# Altium footprint library Connectors.PcbLib: 56 footprints (part 3 of 4)
Each footprint in its own frame and in the unit in brackets; x right, y up, seen from the top. Pads: shape width x height; smd on the part's side, far side on the other; paste and mask are expansions set on the pad; w line width, h text height; cw(c..) or ccw(c..) is an arc to the next point about the centre after c.
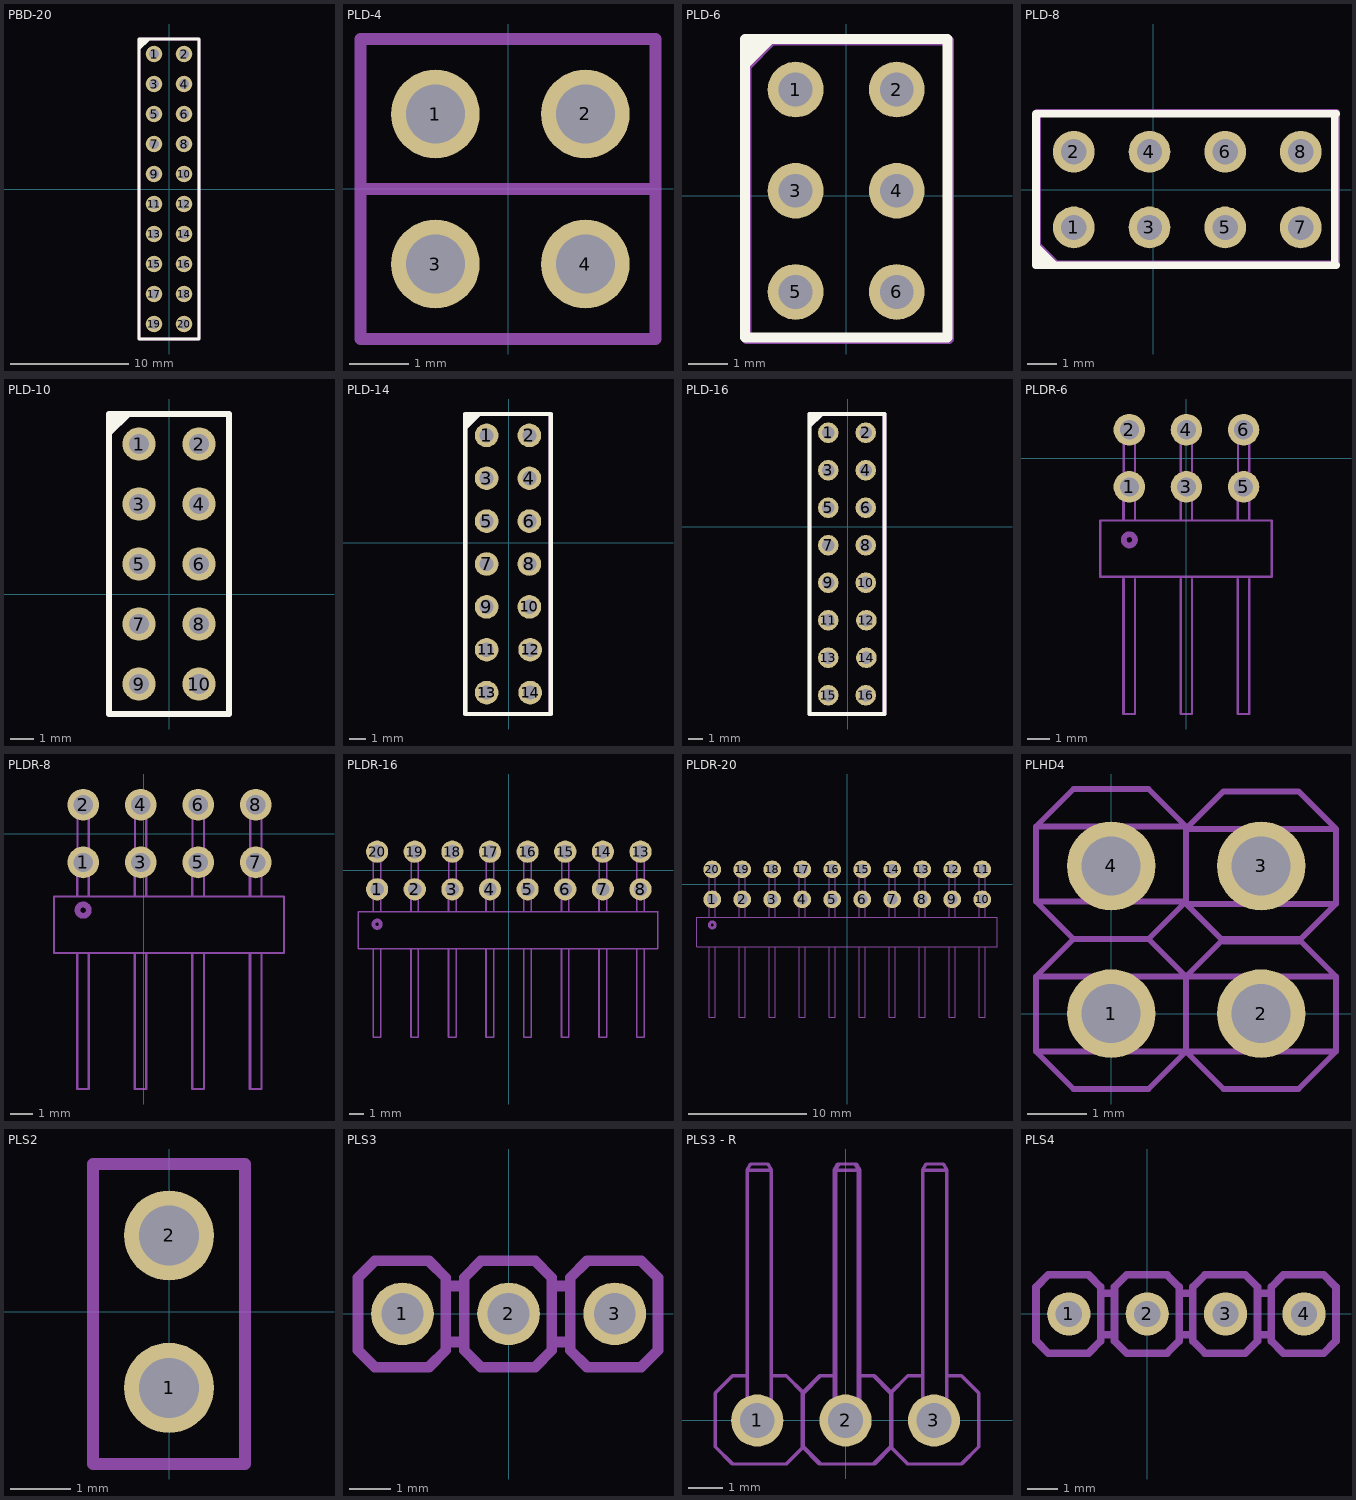
[diagram p2: the footprints below, top view; thin cyan lines are the x and y axes]

## PBD-20 [mm]
pads (20):
  round 1.4 hole 0.85: 1(-1.27,11.43) 2(1.27,11.43) 3(-1.27,8.89) 4(1.27,8.89) 5(-1.27,6.35) 6(1.27,6.35) 7(-1.27,3.81) 8(1.27,3.81) 9(-1.27,1.27) 10(1.27,1.27) 11(-1.27,-1.27) 12(1.27,-1.27) 13(-1.27,-3.81) 14(1.27,-3.81) 15(-1.27,-6.35) 16(1.27,-6.35) 17(-1.27,-8.89) 18(1.27,-8.89) 19(-1.27,-11.43) 20(1.27,-11.43)
Top Overlay:
  region: -1.55,12.7 -2.54,11.71 -2.54,12.7
  region: -2,12.7
  lines w0.254: -2.54,-12.7 -2.54,12.7 2.54,12.7 2.54,-12.7 -2.54,-12.7
Mechanical 13:
  lines w0.254: -2.54,-12.7 2.54,-12.7 2.54,12.7 -2.54,12.7 -2.54,-12.7
3D body "User Library-PBD2_54-20.step": height 8.4, standoff -2.7, extent -2.54,-12.7 2.54,12.7

## PLD-4 [mm]
pads (4):
  round 1.5 hole 1: 1(-1.23,1.27) 2(1.31,1.27) 3(-1.23,-1.27) 4(1.31,-1.27)
Mechanical 13:
  lines w0.2: -2.5,0 2.5,0 ; -2.5,0 -2.5,2.54 2.5,2.54 2.5,0 ; -2.5,0 -2.5,-2.54 2.5,-2.54 2.5,0 ; -2.5,0 2.5,0
3D body "User Library-PLD-2.step": height 8.5, standoff -3, extent -2.5,0 2.5,2.54
3D body "User Library-PLD-2.step": height 8.5, standoff -3, extent -2.5,-2.54 2.5,0

## PLD-6 [mm]
pads (6):
  round 1.4 hole 0.85: 1(-1.27,2.667) 2(1.27,2.667) 3(-1.27,0.127) 4(1.27,0.127) 5(-1.27,-2.413) 6(1.27,-2.413)
Top Overlay:
  lines w0.254: -2.54,3.302 -1.905,3.937 ; -2.54,3.556 -2.159,3.937 ; -2.54,-3.556 2.54,-3.556 2.54,3.937 -2.54,3.937 -2.54,-3.556
Mechanical 13:
  lines w0.254: -2.5,3.262 -1.865,3.897 ; -2.5,3.516 -2.119,3.897 ; -2.5,-3.596 -2.5,3.897 2.58,3.897 2.58,-3.596 -2.5,-3.596
3D body "User Library-PLD-2.step": height 8.5, standoff -3, extent -2.5,-3.683 2.5,-1.143
3D body "User Library-PLD-2.step": height 8.5, standoff -3, extent -2.5,-1.143 2.5,1.397
3D body "User Library-PLD-2.step": height 8.5, standoff -3, extent -2.5,1.397 2.5,3.937

## PLD-8 [mm]
pads (8):
  round 1.4 hole 0.85: 1(-2.667,-1.27) 2(-2.667,1.27) 3(-0.127,-1.27) 4(-0.127,1.27) 5(2.413,-1.27) 6(2.413,1.27) 7(4.953,-1.27) 8(4.953,1.27)
Top Overlay:
  lines w0.254: -3.937,-2.159 -3.556,-2.54 ; -3.937,-1.905 -3.302,-2.54 ; 6.096,-2.54 6.096,2.54 ; 6.136,-2.54 -3.937,-2.54 -3.937,2.54 6.136,2.54
Mechanical 13:
  lines w0.254: -3.897,-2.119 -3.516,-2.5 ; -3.897,-1.865 -3.262,-2.5 ; -3.897,-2.5 6.136,-2.5 6.136,2.58 -3.897,2.58 -3.897,-2.5
3D body "User Library-PLD-2.step": height 8.5, standoff -3, extent -3.937,-2.5 -1.397,2.5
3D body "User Library-PLD-2.step": height 8.5, standoff -3, extent -1.397,-2.5 1.143,2.5
3D body "User Library-PLD-2.step": height 8.5, standoff -3, extent 1.143,-2.5 3.683,2.5
3D body "User Library-PLD-2.step": height 8.5, standoff -3, extent 3.683,-2.5 6.223,2.5

## PLD-10 [mm]
pads (10):
  round 1.4 hole 0.85: 1(-1.27,6.35) 2(1.27,6.35) 3(-1.27,3.81) 4(1.27,3.81) 5(-1.27,1.27) 6(1.27,1.27) 7(-1.27,-1.27) 8(1.27,-1.27) 9(-1.27,-3.81) 10(1.27,-3.81)
Top Overlay:
  region: -1.55,7.62 -2.54,6.63 -2.54,7.62
  region: -2,7.62
  lines w0.254: -2.54,-5.08 2.54,-5.08 2.54,7.62 -2.54,7.62 -2.54,-5.08
Mechanical 13:
  lines w0.254: -2.54,-5.08 2.54,-5.08 2.54,7.62 -2.54,7.62 -2.54,-5.08
3D body "User Library-PLD-2.step": height 8.5, standoff -3, extent -2.46,5.08 2.54,7.62
3D body "User Library-PLD-2.step": height 8.5, standoff -3, extent -2.46,0 2.54,2.54
3D body "User Library-PLD-2.step": height 8.5, standoff -3, extent -2.46,2.54 2.54,5.08
3D body "User Library-PLD-2.step": height 8.5, standoff -3, extent -2.46,-5.08 2.54,-2.54
3D body "User Library-PLD-2.step": height 8.5, standoff -3, extent -2.46,-2.54 2.54,0

## PLD-14 [mm]
pads (14):
  round 1.4 hole 0.85: 1(-1.31,6.35) 2(1.23,6.35) 3(-1.31,3.81) 4(1.23,3.81) 5(-1.31,1.27) 6(1.23,1.27) 7(-1.31,-1.27) 8(1.23,-1.27) 9(-1.31,-3.81) 10(1.23,-3.81) 11(-1.31,-6.35) 12(1.27,-6.35) 13(-1.31,-8.89) 14(1.27,-8.89)
Top Overlay:
  region: -1.59,7.62 -2.58,6.63 -2.58,7.62
  region: -2.04,7.62
  lines w0.254: -2.58,-10.16 2.5,-10.16 2.5,7.62 -2.58,7.62 -2.58,-10.16
Mechanical 13:
  lines w0.254: -2.58,-10.16 2.5,-10.16 2.5,7.62 -2.58,7.62 -2.58,-10.16
3D body "User Library-PLD-2.step": height 8.5, standoff -3, extent -2.5,5.08 2.5,7.62
3D body "User Library-PLD-2.step": height 8.5, standoff -3, extent -2.5,0 2.5,2.54
3D body "User Library-PLD-2.step": height 8.5, standoff -3, extent -2.5,2.54 2.5,5.08
3D body "User Library-PLD-2.step": height 8.5, standoff -3, extent -2.5,-5.08 2.5,-2.54
3D body "User Library-PLD-2.step": height 8.5, standoff -3, extent -2.5,-2.54 2.5,0
3D body "User Library-PLD-2.step": height 8.5, standoff -3, extent -2.5,-7.62 2.5,-5.08
3D body "User Library-PLD-2.step": height 8.5, standoff -3, extent -2.5,-10.16 2.5,-7.62

## PLD-16 [mm]
pads (16):
  round 1.4 hole 0.85: 1(-1.31,6.35) 2(1.23,6.35) 3(-1.31,3.81) 4(1.23,3.81) 5(-1.31,1.27) 6(1.23,1.27) 7(-1.31,-1.27) 8(1.23,-1.27) 9(-1.31,-3.81) 10(1.23,-3.81) 11(-1.31,-6.35) 12(1.27,-6.35) 13(-1.31,-8.89) 14(1.27,-8.89) 15(-1.31,-11.43) 16(1.23,-11.43)
Top Overlay:
  region: -2.04,7.62
  region: -1.59,7.62 -2.58,6.63 -2.58,7.62
  lines w0.254: -2.58,-12.7 -2.58,7.62 2.5,7.62 2.5,-12.7 -2.58,-12.7
Mechanical 13:
  lines w0.254: -2.58,-12.7 -2.58,7.62 2.5,7.62 2.5,-12.7 -2.58,-12.7
3D body "User Library-PLD-2.step": height 8.5, standoff -3, extent -2.5,-10.16 2.5,-7.62
3D body "User Library-PLD-2.step": height 8.5, standoff -3, extent -2.5,-7.62 2.5,-5.08
3D body "User Library-PLD-2.step": height 8.5, standoff -3, extent -2.5,-2.54 2.5,0
3D body "User Library-PLD-2.step": height 8.5, standoff -3, extent -2.5,-5.08 2.5,-2.54
3D body "User Library-PLD-2.step": height 8.5, standoff -3, extent -2.5,2.54 2.5,5.08
3D body "User Library-PLD-2.step": height 8.5, standoff -3, extent -2.5,0 2.5,2.54
3D body "User Library-PLD-2.step": height 8.5, standoff -3, extent -2.5,5.08 2.5,7.62
3D body "User Library-PLD-2.step": height 8.5, standoff -3, extent -2.5,-12.7 2.5,-10.16

## PLDR-6 [mm]
pads (6):
  round 1.4 hole 0.85: 1(-2.54,-1.27) 2(-2.54,1.27) 3(0,-1.27) 4(0,1.27) 5(2.54,-1.27) 6(2.54,1.27)
Mechanical 13:
  circle w0.254: c-2.54,-3.627 r0.25
  circle w0.1: c-2.54,-1.397 r0.25
  circle w0.1: c0,-1.397 r0.25
  circle w0.1: c2.54,-1.397 r0.25
  circle w0.1: c-2.54,1.016 r0.25
  circle w0.1: c0,1.016 r0.25
  circle w0.1: c2.54,1.016 r0.25
  lines w0.1: -2.81,-5.373 -2.81,-11.373 -2.79,-11.373 ; -2.81,-2.77 -2.81,-0.73 -2.79,-0.73 ; -2.79,-5.373 -2.79,-11.373 ; -2.79,-2.77 -2.79,1.27 -2.29,1.27 -2.29,-2.77 ; -2.29,-5.373 -2.29,-11.373 -2.79,-11.373 ; -0.27,-5.373 -0.27,-11.373 -0.25,-11.373 ; -0.27,-2.77 -0.27,-0.73 -0.25,-0.73 ; -0.25,-5.373 -0.25,-11.373 ; -0.25,-2.77 -0.25,1.27 0.25,1.27 0.25,-2.77 ; 0.25,-5.373 0.25,-11.373 -0.25,-11.373 ; 2.27,-5.373 2.27,-11.373 2.29,-11.373 ; 2.27,-2.77 2.27,-0.73 2.29,-0.73 ; 2.29,-5.373 2.29,-11.373 ; 2.29,-2.77 2.29,1.27 2.79,1.27 2.79,-2.77 ; 2.79,-5.373 2.79,-11.373 2.29,-11.373 ; -3.83,-5.27 -3.83,-2.77 3.79,-2.77 3.79,-5.27 -3.83,-5.27
3D body "User Library-PLDR-6.step": height 5.25, standoff -2.75, extent -3.81,-11.27 3.81,1.27

## PLDR-8 [mm]
pads (8):
  round 1.4 hole 0.85: 1(-2.667,-1.27) 2(-2.667,1.27) 3(-0.127,-1.27) 4(-0.127,1.27) 5(2.413,-1.27) 6(2.413,1.27) 7(4.953,-1.27) 8(4.953,1.27)
Mechanical 13:
  circle w0.254: c-2.667,-3.377 r0.25
  circle w0.1: c2.413,1.016 r0.25
  circle w0.1: c-0.127,1.016 r0.25
  circle w0.1: c-2.667,1.016 r0.25
  circle w0.1: c2.413,-1.397 r0.25
  circle w0.1: c-0.127,-1.397 r0.25
  circle w0.1: c-2.667,-1.397 r0.25
  circle w0.1: c4.953,1.016 r0.25
  circle w0.1: c2.413,1.016 r0.25
  circle w0.1: c-0.127,1.016 r0.25
  circle w0.1: c4.953,-1.397 r0.25
  circle w0.1: c2.413,-1.397 r0.25
  circle w0.1: c-0.127,-1.397 r0.25
  lines w0.1: -2.937,-5.27 -2.937,-11.27 -2.917,-11.27 ; -2.937,-2.77 -2.937,-0.73 -2.917,-0.73 ; -2.917,-5.27 -2.917,-11.27 ; -2.917,-2.77 -2.917,1.27 -2.417,1.27 -2.417,-2.77 ; -2.417,-5.27 -2.417,-11.27 -2.917,-11.27 ; -1.417,-5.27 6.203,-5.27 6.203,-2.77 -1.417,-2.77 ; 3.663,-5.27 -3.957,-5.27 -3.957,-2.77 3.663,-2.77 ; 4.683,-5.27 4.683,-11.27 4.703,-11.27 ; 4.683,-2.77 4.683,-0.73 4.703,-0.73 ; 4.703,-5.27 4.703,-11.27 ; 4.703,-2.77 4.703,1.27 5.203,1.27 5.203,-2.77 ; 5.203,-5.27 5.203,-11.27 4.703,-11.27 ; -0.397,-11.27 -0.397,-5.27 -0.397,-11.27 ; -0.397,-11.27 -0.377,-11.27 ; -0.397,-11.27 -0.377,-11.27 ; -0.397,-0.73 -0.397,-2.77 -0.397,-0.73 ; -0.397,-0.73 -0.377,-0.73 -0.397,-0.73 ; -0.377,-11.27 0.123,-11.27 ; -0.377,-11.27 -0.377,-5.27 -0.377,-11.27 ; -0.377,-11.27 0.123,-11.27 ; -0.377,1.27 0.123,1.27 ; -0.377,1.27 -0.377,-2.77 -0.377,1.27 ; -0.377,1.27 0.123,1.27 ; 0.123,-11.27 0.123,-5.27 0.123,-11.27 ; 0.123,1.27 0.123,-2.77 0.123,1.27 ; 2.143,-11.27 2.143,-5.27 2.143,-11.27 ; 2.143,-11.27 2.163,-11.27 ; 2.143,-11.27 2.163,-11.27 ; 2.143,-0.73 2.143,-2.77 2.143,-0.73 ; 2.143,-0.73 2.163,-0.73 2.143,-0.73 ; 2.163,-11.27 2.163,-5.27 2.163,-11.27 ; 2.163,-11.27 2.663,-11.27 ; 2.163,-11.27 2.663,-11.27 ; 2.163,1.27 2.163,-2.77 2.163,1.27 ; 2.163,1.27 2.663,1.27 ; 2.163,1.27 2.663,1.27 ; 2.663,-11.27 2.663,-5.27 2.663,-11.27 ; 2.663,1.27 2.663,-2.77 2.663,1.27
3D body "User Library-PLDR-6.step": height 5.75, standoff -2.25, extent -3.96,-11.207 3.66,1.333
3D body "User Library-PLDR-6.step": height 5.75, standoff -2.25, extent -1.42,-11.207 6.2,1.333

## PLDR-16 [mm]
pads (16):
  round 1.5 hole 0.9: 1(-8.89,-1.27) 2(-6.35,-1.27) 3(-3.81,-1.27) 4(-1.27,-1.27) 5(1.27,-1.27) 6(3.81,-1.27) 7(6.35,-1.27) 8(8.89,-1.27) 13(8.89,1.27) 14(6.35,1.27) 15(3.81,1.27) 16(1.27,1.27) 17(-1.27,1.27) 18(-3.81,1.27) 19(-6.35,1.27) 20(-8.89,1.27)
Mechanical 13:
  circle w0.254: c-8.89,-3.627 r0.25
  circle w0.1: c-8.89,-1.397 r0.25
  circle w0.1: c-6.35,-1.397 r0.25
  circle w0.1: c-3.81,-1.397 r0.25
  circle w0.1: c-1.27,-1.397 r0.25
  circle w0.1: c1.27,-1.397 r0.25
  circle w0.1: c3.81,-1.397 r0.25
  circle w0.1: c6.35,-1.397 r0.25
  circle w0.1: c8.89,-1.397 r0.25
  circle w0.1: c-8.89,1.016 r0.25
  circle w0.1: c-6.35,1.016 r0.25
  circle w0.1: c-3.81,1.016 r0.25
  circle w0.1: c-1.27,1.016 r0.25
  circle w0.1: c1.247,1.016 r0.25
  circle w0.1: c3.81,1.016 r0.25
  circle w0.1: c6.35,1.016 r0.25
  circle w0.1: c8.89,1.016 r0.25
  lines w0.1: -9.16,-5.27 -9.16,-11.27 -9.14,-11.27 ; -9.16,-2.77 -9.16,-0.73 -9.14,-0.73 ; -9.14,-5.27 -9.14,-11.27 ; -9.14,-2.77 -9.14,1.27 -8.64,1.27 -8.64,-2.77 ; -8.64,-5.27 -8.64,-11.27 -9.14,-11.27 ; -6.62,-5.27 -6.62,-11.27 -6.6,-11.27 ; -6.62,-2.77 -6.62,-0.73 -6.6,-0.73 ; -6.6,-5.27 -6.6,-11.27 ; -6.6,-2.77 -6.6,1.27 -6.1,1.27 -6.1,-2.77 ; -6.1,-5.27 -6.1,-11.27 -6.6,-11.27 ; -4.08,-5.27 -4.08,-11.27 -4.06,-11.27 ; -4.08,-2.77 -4.08,-0.73 -4.06,-0.73 ; -4.06,-5.27 -4.06,-11.27 ; -4.06,-2.77 -4.06,1.27 -3.56,1.27 -3.56,-2.77 ; -3.56,-5.27 -3.56,-11.27 -4.06,-11.27 ; -1.54,-5.27 -1.54,-11.27 -1.52,-11.27 ; -1.54,-2.77 -1.54,-0.73 -1.52,-0.73 ; -1.52,-5.27 -1.52,-11.27 ; -1.52,-2.77 -1.52,1.27 -1.02,1.27 -1.02,-2.77 ; -1.02,-5.27 -1.02,-11.27 -1.52,-11.27 ; 1,-5.27 1,-11.27 1.02,-11.27 ; 1,-2.77 1,-0.73 1.02,-0.73 ; 1.02,-5.27 1.02,-11.27 ; 1.02,-2.77 1.02,1.27 1.52,1.27 1.52,-2.77 ; 1.52,-5.27 1.52,-11.27 1.02,-11.27 ; 3.54,-5.27 3.54,-11.27 3.56,-11.27 ; 3.54,-2.77 3.54,-0.73 3.56,-0.73 ; 3.56,-5.27 3.56,-11.27 ; 3.56,-2.77 3.56,1.27 4.06,1.27 4.06,-2.77 ; 4.06,-5.27 4.06,-11.27 3.56,-11.27 ; 6.08,-5.27 6.08,-11.27 6.1,-11.27 ; 6.08,-2.77 6.08,-0.73 6.1,-0.73 ; 6.1,-5.27 6.1,-11.27 ; 6.1,-2.77 6.1,1.27 6.6,1.27 6.6,-2.77 ; 6.6,-5.27 6.6,-11.27 6.1,-11.27 ; 10.05,-2.77 10.05,-5.27 -2.56,-5.27 -10.18,-5.27 -10.18,-2.77 -2.56,-2.77 10.07,-2.77 ; 8.62,-11.27 8.64,-11.27 ; 8.62,-11.27 8.64,-11.27 ; 8.62,-11.27 8.62,-5.27 8.62,-11.27 ; 8.62,-0.73 8.64,-0.73 8.62,-0.73 ; 8.62,-0.73 8.62,-2.77 8.62,-0.73 ; 8.64,-11.27 9.14,-11.27 ; 8.64,-11.27 9.14,-11.27 ; 8.64,-11.27 8.64,-5.27 8.64,-11.27 ; 8.64,1.27 9.14,1.27 ; 8.64,1.27 9.14,1.27 ; 8.64,1.27 8.64,-2.77 8.64,1.27 ; 9.14,-11.27 9.14,-5.27 9.14,-11.27 ; 9.14,1.27 9.14,-2.77 9.14,1.27
3D body "User Library-PLDR-6.step": height 5.25, standoff -2.75, extent 2.517,-11.207 10.137,1.333
3D body "User Library-PLDR-6.step": height 5.25, standoff -2.75, extent -10.183,-11.207 -2.563,1.333
3D body "User Library-PLDR-6.step": height 5.25, standoff -2.75, extent -2.563,-11.207 5.057,1.333

## PLDR-20 [mm]
pads (20):
  round 1.5 hole 0.9: 1(-11.43,-1.27) 2(-8.89,-1.27) 3(-6.35,-1.27) 4(-3.81,-1.27) 5(-1.27,-1.27) 6(1.27,-1.27) 7(3.81,-1.27) 8(6.35,-1.27) 9(8.89,-1.27) 10(11.43,-1.27) 11(11.43,1.27) 12(8.89,1.27) 13(6.35,1.27) 14(3.81,1.27) 15(1.27,1.27) 16(-1.27,1.27) 17(-3.81,1.27) 18(-6.35,1.27) 19(-8.89,1.27) 20(-11.43,1.27)
Mechanical 13:
  drawing of 151 lines, arcs and shapes, not listed
3D body "User Library-PLDR-6.step": height 5.75, standoff -2.25, extent 5.057,-11.207 12.677,1.333
3D body "User Library-PLDR-6.step": height 5.75, standoff -2.25, extent 2.517,-11.207 10.137,1.333
3D body "User Library-PLDR-6.step": height 5.75, standoff -2.25, extent -5.103,-11.207 2.517,1.333
3D body "User Library-PLDR-6.step": height 5.75, standoff -2.25, extent -12.723,-11.207 -5.103,1.333

## PLHD4 [mm]
pads (4):
  round 1.5 hole 1: 1(0,0) 2(2.54,0) 3(2.54,2.5) 4(0,2.5)
Mechanical 13:
  lines w0.1: -1.273,-0.642 1.267,-0.642 ; -1.273,-0.642 -0.638,-1.277 0.632,-1.277 1.267,-0.642 ; -1.273,-0.642 -1.273,0.628 ; -1.273,0.628 1.267,0.628 ; -1.273,0.628 -0.638,1.263 ; -1.273,1.898 1.267,1.898 ; -1.273,1.898 -0.638,1.263 ; -1.273,1.898 -1.273,3.168 ; -1.273,3.168 1.267,3.168 ; -1.273,3.168 -0.638,3.803 0.632,3.803 1.267,3.168 ; -0.638,1.263 0.632,1.263 ; -0.638,1.263 0.632,1.263 ; -0.273,-0.277 -0.223,-0.227 ; -0.273,-0.277 -0.323,-0.227 -0.323,0.213 -0.273,0.263 ; -0.273,-0.277 -0.223,-0.327 0.217,-0.327 0.267,-0.277 ; -0.273,0.263 -0.223,0.213 ; -0.273,0.263 -0.223,0.313 0.217,0.313 0.267,0.263 ; -0.273,2.263 -0.223,2.313 ; -0.273,2.263 -0.323,2.313 -0.323,2.753 -0.273,2.803 ; -0.273,2.263 -0.223,2.213 0.217,2.213 0.267,2.263 ; -0.273,2.803 -0.223,2.753 ; -0.273,2.803 -0.223,2.853 0.217,2.853 0.267,2.803 ; -0.223,-0.227 -0.223,0.213 ; -0.223,-0.227 0.217,-0.227 ; -0.223,0.213 0.217,0.213 ; -0.223,2.313 -0.223,2.753 ; -0.223,2.313 0.217,2.313 ; -0.223,2.753 0.217,2.753 ; 0.217,-0.227 0.217,0.213 ; 0.217,-0.227 0.267,-0.277 ; 0.217,0.213 0.267,0.263 ; 0.217,2.313 0.217,2.753 ; 0.217,2.313 0.267,2.263 ; 0.217,2.753 0.267,2.803 ; 0.267,-0.277 0.317,-0.227 0.317,0.213 0.267,0.263 ; 0.267,2.263 0.317,2.313 0.317,2.753 0.267,2.803 ; 0.632,1.263 1.267,1.898 ; 0.632,1.263 1.267,0.628 ; 1.267,-0.642 3.807,-0.642 ; 1.267,-0.642 1.902,-1.277 3.172,-1.277 3.807,-0.642 ; 1.267,-0.642 1.267,0.628 ; 1.267,-0.642 1.267,0.628 ; 1.267,0.628 3.807,0.628 ; 1.267,0.628 1.902,1.263 3.172,1.263 3.807,0.628 ; 1.267,1.858 3.807,1.858 ; 1.267,1.858 1.902,1.223 3.172,1.223 3.807,1.858 ; 1.267,1.858 1.267,3.128 ; 1.267,1.898 1.267,3.168 ; 1.267,3.128 3.807,3.128 ; 1.267,3.128 1.902,3.763 3.172,3.763 3.807,3.128 ; 2.267,-0.277 2.317,-0.227 ; 2.267,-0.277 2.217,-0.227 2.217,0.213 2.267,0.263 ; 2.267,-0.277 2.317,-0.327 2.757,-0.327 2.807,-0.277 ; 2.267,0.263 2.317,0.213 ; 2.267,0.263 2.317,0.313 2.757,0.313 2.807,0.263 ; 2.267,2.223 2.317,2.273 ; 2.267,2.223 2.217,2.273 2.217,2.713 2.267,2.763 ; 2.267,2.223 2.317,2.173 2.757,2.173 2.807,2.223 ; 2.267,2.763 2.317,2.713 ; 2.267,2.763 2.317,2.813 2.757,2.813 2.807,2.763 ; 2.317,-0.227 2.317,0.213 ; 2.317,-0.227 2.757,-0.227 ; 2.317,0.213 2.757,0.213 ; 2.317,2.273 2.317,2.713 ; 2.317,2.273 2.757,2.273 ; 2.317,2.713 2.757,2.713 ; 2.757,-0.227 2.757,0.213 ; 2.757,-0.227 2.807,-0.277 ; 2.757,0.213 2.807,0.263 ; 2.757,2.273 2.757,2.713 ; 2.757,2.273 2.807,2.223 ; 2.757,2.713 2.807,2.763 ; 2.807,-0.277 2.857,-0.227 2.857,0.213 2.807,0.263 ; 2.807,2.223 2.857,2.273 2.857,2.713 2.807,2.763 ; 3.807,-0.642 3.807,0.628 ; 3.807,1.858 3.807,3.128
3D body "User Library-PLH-1.step": height 15.9, standoff -3, extent -1.273,-1.277 1.267,1.263
3D body "User Library-PLH-1.step": height 15.9, standoff -3, extent 1.267,-1.277 3.807,1.263
3D body "User Library-PLH-1.step": height 15.9, standoff -3, extent 1.267,1.223 3.807,3.763
3D body "User Library-PLH-1.step": height 15.9, standoff -3, extent -1.273,1.223 1.267,3.763

## PLS2 [mm]
pads (2):
  round 1.5 hole 1: 1(0,-1.27) 2(0,1.27)
Mechanical 13:
  lines w0.2: -1.27,-2.54 -1.27,2.46 1.27,2.46 1.27,-2.54 -1.27,-2.54
3D body "User Library-PLD-2.step": height 8.5, standoff -3, extent -1.27,-2.54 1.27,2.46

## PLS3 [mm]
pads (3):
  round 1.5 hole 1: 1(-2.54,0) 2(0,0) 3(2.54,0)
Mechanical 13:
  lines w0.254: -1.504,-0.674 -1.064,-0.674 ; -1.504,0.666 -1.064,0.666 ; 1.036,-0.674 1.476,-0.674 ; 1.036,0.666 1.476,0.666 ; -2.874,-0.324 -2.234,-0.324 ; -2.874,-0.324 -2.874,0.316 ; -2.874,-0.324 -2.674,-0.124 ; -2.874,0.316 -2.234,0.316 ; -2.874,0.316 -2.674,0.116 ; -2.674,-0.124 -2.434,-0.124 ; -2.674,-0.124 -2.674,0.116 ; -2.674,0.116 -2.434,0.116 ; -2.434,-0.124 -2.234,-0.324 ; -2.434,-0.124 -2.434,0.116 ; -2.434,0.116 -2.234,0.316 ; -2.234,-0.324 -2.234,0.316 ; -0.334,-0.324 -0.334,0.316 ; -0.334,-0.324 -0.134,-0.124 ; -0.334,-0.324 0.306,-0.324 ; -0.334,0.316 -0.134,0.116 ; -0.334,0.316 0.306,0.316 ; -0.134,-0.124 0.106,-0.124 ; -0.134,-0.124 -0.134,0.116 ; -0.134,0.116 0.106,0.116 ; 0.106,-0.124 0.306,-0.324 ; 0.106,-0.124 0.106,0.116 ; 0.106,0.116 0.306,0.316 ; 0.306,-0.324 0.306,0.316 ; 2.206,-0.324 2.846,-0.324 ; 2.206,-0.324 2.206,0.316 ; 2.206,-0.324 2.406,-0.124 ; 2.206,0.316 2.406,0.116 ; 2.206,0.316 2.846,0.316 ; 2.406,-0.124 2.646,-0.124 ; 2.406,-0.124 2.406,0.116 ; 2.406,0.116 2.646,0.116 ; 2.646,-0.124 2.846,-0.324 ; 2.646,-0.124 2.646,0.116 ; 2.646,0.116 2.846,0.316 ; 2.846,-0.324 2.846,0.316 ; -3.604,-0.874 -3.604,0.866 -3.204,1.266 -1.904,1.266 -1.504,0.866 -1.504,-0.874 -1.904,-1.274 -3.204,-1.274 -3.604,-0.874 ; -1.064,-0.874 -1.064,0.866 -0.664,1.266 0.636,1.266 1.036,0.866 1.036,-0.874 0.636,-1.274 -0.664,-1.274 -1.064,-0.874 ; 1.476,-0.874 1.476,0.866 1.876,1.266 3.176,1.266 3.576,0.866 3.576,-0.874 3.176,-1.274 1.876,-1.274 1.476,-0.874
3D body "User Library-PLD-2.step": height 8.5, standoff -3, extent -1.19,-1.27 3.81,1.27
3D body "User Library-PLD-2.step": height 8.5, standoff -3, extent -3.73,-1.27 1.27,1.27

## PLS3 - R [mm]
pads (3):
  round 1.5 hole 1: 1(-2.54,0) 2(0,0) 3(2.54,0)
Mechanical 13:
  lines w0.1: -2.83,1.29 -3.25,1.29 -3.75,0.79 -3.75,-0.75 -3.25,-1.25 -1.71,-1.25 -1.21,-0.75 ; -2.13,1.29 -1.71,1.29 -1.21,0.79 ; -0.33,1.29 -0.75,1.29 -1.25,0.79 -1.25,-0.75 -0.75,-1.25 0.79,-1.25 1.29,-0.75 ; -0.29,1.29 -0.71,1.29 -1.21,0.79 ; 0.37,1.29 0.79,1.29 1.29,0.79 ; 0.41,1.29 0.83,1.29 1.33,0.79 ; 2.21,1.29 1.79,1.29 1.29,0.79 ; 2.91,1.29 3.33,1.29 3.83,0.79 ; -2.83,0.37 -2.13,0.37 ; -2.83,0.37 -2.83,-0.33 -2.13,-0.33 -2.13,0.37 ; -2.83,0.37 -2.83,7.197 ; -2.83,7.197 -2.73,7.37 -2.23,7.37 -2.13,7.197 ; -2.83,7.197 -2.13,7.197 ; -2.13,0.37 -2.13,7.197 ; -1.21,-0.75 -0.71,-1.25 0.83,-1.25 1.33,-0.75 ; -1.21,-0.75 -1.21,0.79 ; -0.33,0.37 0.37,0.37 ; -0.33,0.37 -0.33,-0.33 0.37,-0.33 0.37,0.37 ; -0.33,0.37 -0.33,7.197 ; -0.33,7.197 -0.23,7.37 0.27,7.37 0.37,7.197 ; -0.33,7.197 0.37,7.197 ; -0.29,0.37 0.41,0.37 ; -0.29,0.37 -0.29,-0.33 0.41,-0.33 0.41,0.37 ; -0.29,0.37 -0.29,7.197 ; -0.29,7.197 -0.19,7.37 0.31,7.37 0.41,7.197 ; -0.29,7.197 0.41,7.197 ; 0.37,0.37 0.37,7.197 ; 0.41,0.37 0.41,7.197 ; 1.29,-0.75 1.79,-1.25 3.33,-1.25 3.83,-0.75 ; 1.29,-0.75 1.29,0.79 ; 1.33,-0.75 1.33,0.79 ; 1.33,-0.75 1.33,0.79 ; 2.21,0.37 2.91,0.37 ; 2.21,0.37 2.21,-0.33 2.91,-0.33 2.91,0.37 ; 2.21,0.37 2.21,7.197 ; 2.21,7.197 2.31,7.37 2.81,7.37 2.91,7.197 ; 2.21,7.197 2.91,7.197 ; 2.91,0.37 2.91,7.197 ; 3.83,-0.75 3.83,0.79 ; 3.83,-0.75 3.83,0.79
3D body "User Library-PLS-1R_D1.STEP": height 2.5, standoff -3, extent -3.81,-0.32 -1.27,10.04
3D body "User Library-PLS-1R_D1.STEP": height 2.5, standoff -3, extent -1.27,-0.32 1.27,10.04
3D body "User Library-PLS-1R_D1.STEP": height 2.5, standoff -3, extent 1.27,-0.32 3.81,10.04

## PLS4 [mm]
pads (4):
  round 1.4 hole 0.85: 1(-2.54,0) 2(0,0) 3(2.54,0) 4(5.08,0)
Mechanical 13:
  lines w0.254: -1.504,-0.674 -1.064,-0.674 ; -1.504,0.666 -1.064,0.666 ; 1.036,-0.674 1.476,-0.674 ; 1.036,0.666 1.476,0.666 ; 3.576,-0.674 4.016,-0.674 ; 3.576,0.666 4.016,0.666 ; -2.874,-0.324 -2.234,-0.324 ; -2.874,-0.324 -2.874,0.316 ; -2.874,-0.324 -2.674,-0.124 ; -2.874,0.316 -2.234,0.316 ; -2.874,0.316 -2.674,0.116 ; -2.674,-0.124 -2.434,-0.124 ; -2.674,-0.124 -2.674,0.116 ; -2.674,0.116 -2.434,0.116 ; -2.434,-0.124 -2.234,-0.324 ; -2.434,-0.124 -2.434,0.116 ; -2.434,0.116 -2.234,0.316 ; -2.234,-0.324 -2.234,0.316 ; -0.334,-0.324 -0.334,0.316 ; -0.334,-0.324 -0.134,-0.124 ; -0.334,-0.324 0.306,-0.324 ; -0.334,0.316 -0.134,0.116 ; -0.334,0.316 0.306,0.316 ; -0.134,-0.124 0.106,-0.124 ; -0.134,-0.124 -0.134,0.116 ; -0.134,0.116 0.106,0.116 ; 0.106,-0.124 0.306,-0.324 ; 0.106,-0.124 0.106,0.116 ; 0.106,0.116 0.306,0.316 ; 0.306,-0.324 0.306,0.316 ; 2.206,-0.324 2.846,-0.324 ; 2.206,-0.324 2.206,0.316 ; 2.206,-0.324 2.406,-0.124 ; 2.206,0.316 2.406,0.116 ; 2.206,0.316 2.846,0.316 ; 2.406,-0.124 2.646,-0.124 ; 2.406,-0.124 2.406,0.116 ; 2.406,0.116 2.646,0.116 ; 2.646,-0.124 2.846,-0.324 ; 2.646,-0.124 2.646,0.116 ; 2.646,0.116 2.846,0.316 ; 2.846,-0.324 2.846,0.316 ; 3.576,-0.874 3.576,0.866 ; 3.576,-0.874 3.576,0.866 ; 3.576,-0.874 3.176,-1.274 1.876,-1.274 1.476,-0.874 1.476,0.866 1.876,1.266 3.176,1.266 3.576,0.866 ; 4.746,-0.324 4.946,-0.124 ; 4.746,-0.324 4.746,0.316 ; 4.746,-0.324 5.386,-0.324 ; 4.746,0.316 5.386,0.316 ; 4.746,0.316 4.946,0.116 ; 4.946,-0.124 4.946,0.116 ; 4.946,-0.124 5.186,-0.124 ; 4.946,0.116 5.186,0.116 ; 5.186,-0.124 5.186,0.116 ; 5.186,-0.124 5.386,-0.324 ; 5.186,0.116 5.386,0.316 ; 5.386,-0.324 5.386,0.316 ; -3.604,-0.874 -3.604,0.866 -3.204,1.266 -1.904,1.266 -1.504,0.866 -1.504,-0.874 -1.904,-1.274 -3.204,-1.274 -3.604,-0.874 ; -1.064,-0.874 -1.064,0.866 -0.664,1.266 0.636,1.266 1.036,0.866 1.036,-0.874 0.636,-1.274 -0.664,-1.274 -1.064,-0.874 ; 4.016,-0.874 4.416,-1.274 5.716,-1.274 6.116,-0.874 6.116,0.866 5.716,1.266 4.416,1.266 4.016,0.866 4.016,-0.874
3D body "User Library-PLD-2.step": height 8.5, standoff -3, extent 1.35,-1.27 6.35,1.27
3D body "User Library-PLD-2.step": height 8.5, standoff -3, extent -3.73,-1.27 1.27,1.27